# Altium footprint library Conectores.PcbLib: 68 footprints (part 3 of 5)
Each footprint in its own frame and in the unit in brackets; x right, y up, seen from the top. Pads: shape width x height; smd on the part's side, far side on the other; paste and mask are expansions set on the pad; w line width, h text height; cw(c..) or ccw(c..) is an arc to the next point about the centre after c.
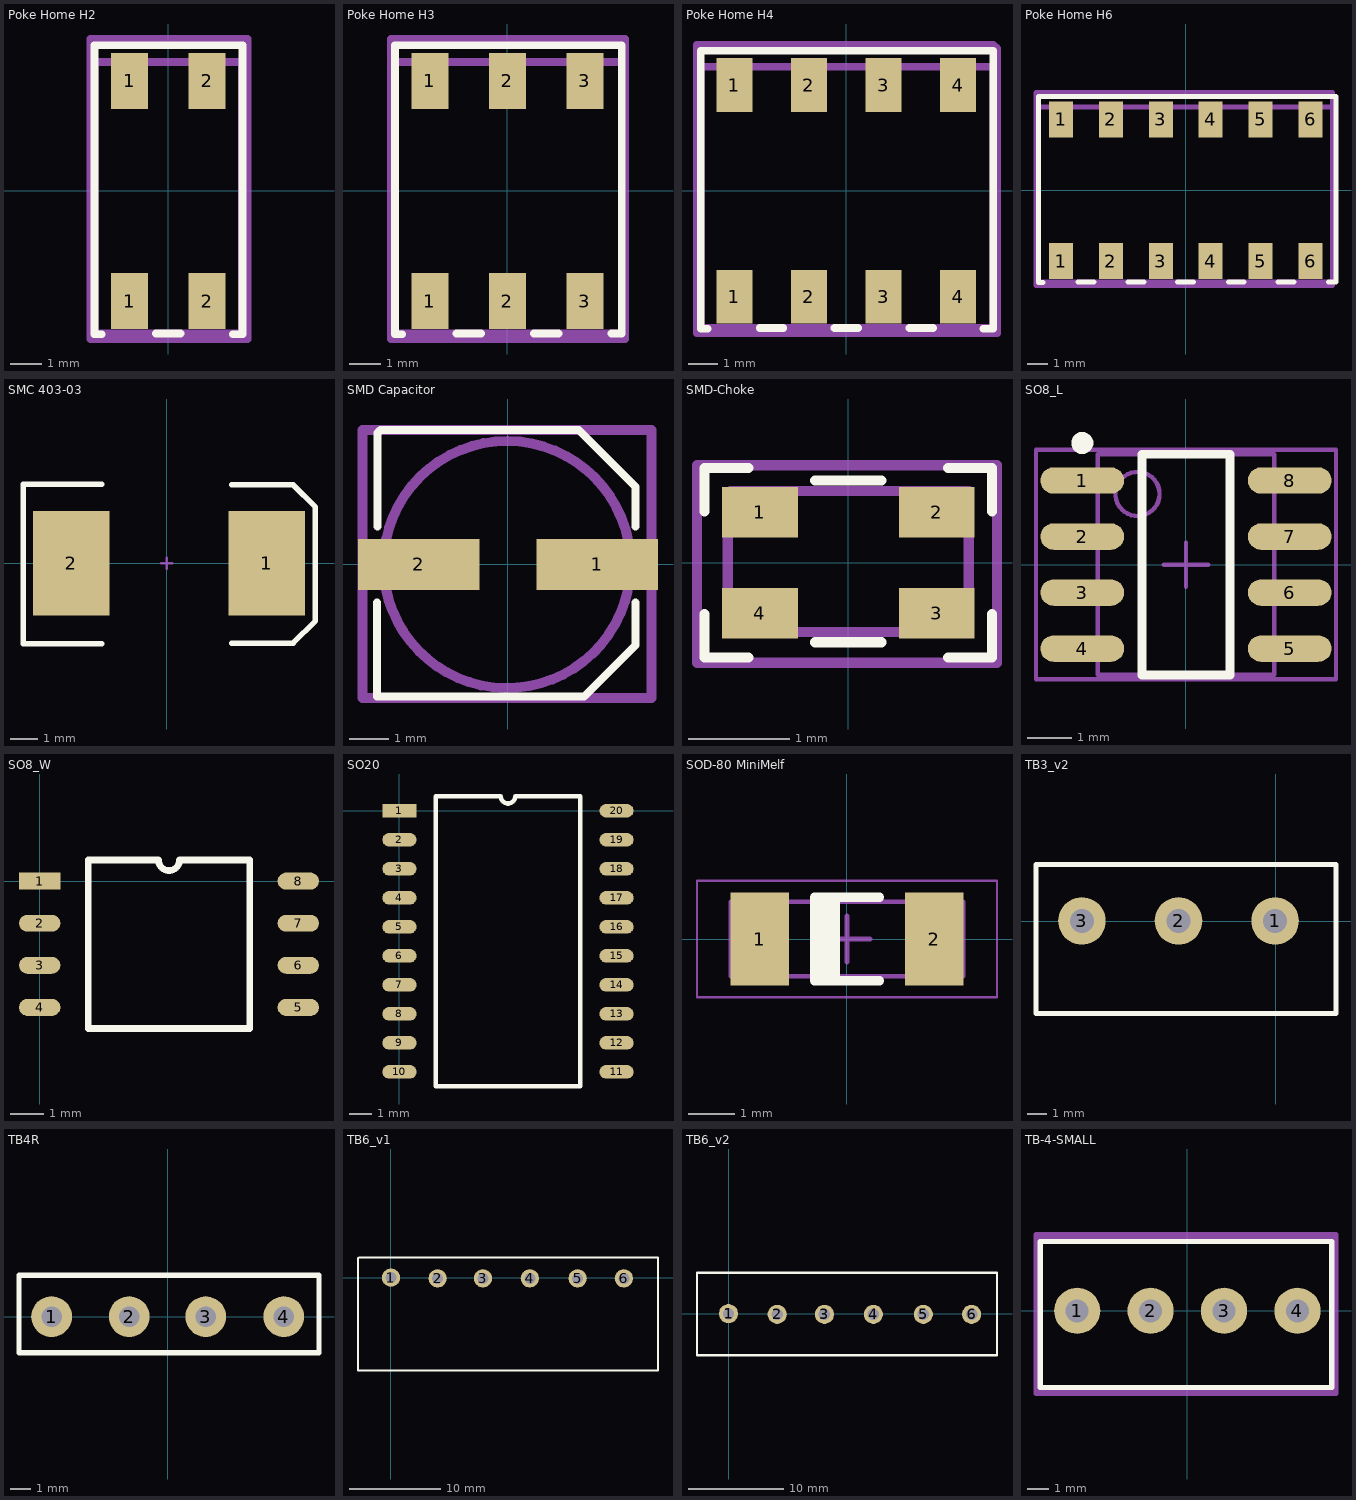
[diagram p2: the footprints below, top view; thin cyan lines are the x and y axes]

## Poke Home H2 [mm] "AVX Poke-Home: Horizontal 18-26 AWG: WTB - 2 ways"
pads (4):
  rect 1.2x1.8 smd: 1(-1.25,-3.55) 1(-1.25,3.55) 2(1.25,-3.55) 2(1.25,3.55)
Top Overlay:
  lines w0.254: -2.148,-4.623 -2.377,-4.623 -2.377,4.699 2.398,4.699 2.398,-4.623 2.094,-4.623 ; -0.396,-4.597 0.392,-4.597
Mechanical 13:
  lines w0.254: -2.377,-4.597 -2.377,4.166 2.373,4.166 2.373,-4.597 -2.377,-4.597
Mechanical 15:
  lines w0.254: -2.504,-4.775 2.551,-4.775 2.551,4.902 -2.504,4.902 -2.504,-4.775
3D body: height 5.1, standoff 0, extent -2.489,-4.674 2.511,4.326

## Poke Home H3 [mm] "AVX Poke-Home: Horizontal 18-26 AWG: WTB - 3 ways"
pads (6):
  rect 1.2x1.8 smd: 1(-2.5,-3.55) 1(-2.5,3.55) 2(0,-3.55) 2(0,3.55) 3(2.5,-3.55) 3(2.5,3.55)
Top Overlay:
  lines w0.254: -3.398,-4.623 -3.627,-4.623 -3.627,4.699 3.688,4.699 3.688,-4.597 3.358,-4.597 ; -1.646,-4.597 -0.858,-4.597 ; 0.856,-4.597 1.644,-4.597
Mechanical 13:
  lines w0.254: -3.627,-4.597 3.688,-4.597 3.688,4.166 -3.627,4.166 -3.627,-4.597
Mechanical 15:
  lines w0.254: -3.754,-4.775 -3.754,4.902 3.79,4.902 3.79,-4.775 -3.754,-4.775
3D body: height 5.1, standoff 0, extent -3.754,-4.703 3.746,4.297

## Poke Home H4 [mm] "AVX Poke-Home: Horizontal 18-26 AWG: WTB - 4 ways"
pads (8):
  rect 1.2x1.8 smd: 1(-3.75,-3.55) 1(-3.75,3.55) 2(-1.25,-3.55) 2(-1.25,3.55) 3(1.25,-3.55) 3(1.25,3.55) 4(3.75,-3.55) 4(3.75,3.55)
Top Overlay:
  lines w0.254: -4.648,-4.623 -4.877,-4.623 -4.877,4.699 4.928,4.699 4.928,-4.623 4.597,-4.623 ; -2.896,-4.597 -2.108,-4.597 ; -0.394,-4.597 0.394,-4.597 ; 2.121,-4.597 2.908,-4.597
Mechanical 13:
  lines w0.254: -4.877,-4.597 -4.877,4.166 4.928,4.166 4.928,-4.597 -4.877,-4.597
Mechanical 15:
  lines w0.254: -5.004,-4.775 5.055,-4.775 5.055,4.775 4.928,4.902 -5.004,4.902 -5.004,-4.775
3D body: height 5.1, standoff 0, extent -4.995,-4.735 5.005,4.265

## Poke Home H6 [mm] "AVX Poke-Home: Horizontal 18-26 AWG: WTB - 6 ways"
pads (12):
  rect 1.2x1.8 smd: 1(-6.25,-3.55) 1(-6.25,3.55) 2(-3.75,-3.55) 2(-3.75,3.55) 3(-1.25,-3.55) 3(-1.25,3.55) 4(1.25,-3.55) 4(1.25,3.55) 5(3.75,-3.55) 5(3.75,3.55) 6(6.25,-3.55) 6(6.25,3.55)
Top Overlay:
  lines w0.254: -7.148,-4.623 -7.377,-4.623 -7.377,4.699 7.528,4.699 7.528,-4.597 7.147,-4.597 ; -5.396,-4.597 -4.608,-4.597 ; -2.894,-4.597 -2.106,-4.597 ; -0.405,-4.597 0.383,-4.597 ; 2.135,-4.597 2.923,-4.597 ; 4.625,-4.597 5.412,-4.597
Mechanical 13:
  lines w0.254: -7.377,-4.597 7.401,-4.597 7.401,4.166 -7.377,4.166 -7.377,-4.597
Mechanical 15:
  lines w0.254: -7.504,-4.775 -7.504,4.902 7.35,4.902 7.35,-4.775 -7.504,-4.775
3D body: height 5.1, standoff 0, extent -7.475,-4.724 7.525,4.276

## SMC 403-03 [mil] "SMC; 2 C-Bend Leads"
height 104.33
pads (2):
  rect 110x150 smd: 1(144.17,0) 2(-137.81,0)
Top Overlay:
  lines w7.87: -93.5,-116 -207,-116 -207,114 -93.5,114 ; 93.5,-115 182,-115 214,-83 214,80.76 182.11,113 93.5,113
Mechanical 1:
  lines w3.94: -7.87,0 7.87,0 ; 0,-7.87 0,7.87
3D body: height 86.61, standoff 0, extent -156.48,-118.13 158.48,116.13

## SMD Capacitor [mm] "SMD Aluminum Cap. 6.3x6.3 mm"
pads (2):
  rect 3.1x1.3 smd: 1(2.275,0) 2(-2.275,0)
Top Overlay:
  lines w0.2: -3.338,-0.965 -3.338,-3.368 1.941,-3.368 3.251,-2.057 3.251,-0.965 ; -3.327,0.965 -3.327,3.353 -3.251,3.429 1.803,3.429 3.251,1.981 3.251,0.972
Mechanical 13:
  lines w0.254: 2.991,0.908 ccw(c-0.025,0) 3.007,0.852
Mechanical 15:
  lines w0.254: -3.708,-3.404 -3.708,3.429 3.658,3.429 3.658,-3.404 -3.708,-3.404
3D body: height 3.91, standoff 0, extent -3.52,-3.3 3.48,3.3

## SMD-Choke [mm] "2 Line Common Mode Choke Surface Mount - DLW21H"
pads (4):
  rect 0.75x0.5 smd: 1(-0.875,0.5) 2(0.875,0.5) 3(0.875,-0.5) 4(-0.875,-0.5)
Top Overlay:
  lines w0.1: -1.422,-0.508 -1.422,-0.94 -0.991,-0.94 ; -1.422,0.508 -1.422,0.94 -0.991,0.94 ; -0.33,-0.787 0.33,-0.787 ; -0.33,0.813 0.33,0.813 ; 0.991,-0.94 1.422,-0.94 1.422,-0.508 ; 0.991,0.94 1.422,0.94 1.422,0.508
Mechanical 13:
  lines w0.1: -1.194,0.686 -1.194,-0.686 1.194,-0.686 1.194,0.711 -1.168,0.711
Mechanical 15:
  lines w0.1: -1.499,-0.991 1.473,-0.991 1.473,0.965 -1.499,0.965 -1.499,-0.991
3D body: height 1, standoff 0, extent -1.162,-0.692 1.139,0.708

## SO8_L [mm] "SOIC-8 Narrow, Pitch 1.27mm, OP07"
height 1.75
pads (8):
  oval 1.9x0.6 smd: 1(-2.35,1.905) 2(-2.35,0.635) 3(-2.35,-0.635) 4(-2.35,-1.905) 5(2.35,-1.905) 6(2.35,-0.635) 7(2.35,0.635) 8(2.35,1.905)
Top Overlay:
  circle w0.25: c-2.35,2.755 r0.125
  lines w0.2: -1,-2.5 1,-2.5 1,2.5 -1,2.5 -1,-2.5
Mechanical 13:
  circle w0.1: c-1.1,1.6 r0.5
  lines w0.1: -2,-2.5 2,-2.5 2,2.5 -2,2.5 -2,-2.5
Mechanical 15:
  lines w0.1: -0.5,0 0.5,0 ; 0,-0.5 0,0.5 ; -3.4,-2.6 3.4,-2.6 3.4,2.6 -3.4,2.6 -3.4,-2.6
3D body: height 1.7, standoff 0, extent -3,-2.424 3,2.476

## SO8_W [mm] "SOIC-8 Wide"
pads (8):
  rect 1.25x0.51 smd: 1(0,0)
  oval 1.25x0.51 smd: 2(0,-1.27) 3(0,-2.54) 4(0,-3.81) 5(7.8,-3.81) 6(7.8,-2.54) 7(7.8,-1.27) 8(7.8,0)
Top Overlay:
  lines w0.2: 1.46,-4.445 6.34,-4.445 6.34,0.635 4.217,0.635 cw(c3.9,0.635) 3.582,0.635 1.46,0.635 1.46,-4.445
3D body: height 1.75, standoff -0.01, extent -0.14,-4.635 7.962,0.825

## SO20 [mm] "SOT163-1: plastic small outline package; 20 leads; body width 7.5 mm"
pads (20):
  rect 1.5x0.6 smd: 1(0,0)
  oval 1.5x0.6 smd: 2(0,-1.27) 3(0,-2.54) 4(0,-3.81) 5(0,-5.08) 6(0,-6.35) 7(0,-7.62) 8(0,-8.89) 9(0,-10.16) 10(0,-11.43) 11(9.5,-11.43) 12(9.5,-10.16) 13(9.5,-8.89) 14(9.5,-7.62) 15(9.5,-6.35) 16(9.5,-5.08) 17(9.5,-3.81) 18(9.5,-2.54) 19(9.5,-1.27) 20(9.5,0)
Top Overlay:
  lines w0.2: 1.585,-12.065 7.915,-12.065 7.915,0.635 5.067,0.635 cw(c4.75,0.635) 4.432,0.635 1.585,0.635 1.585,-12.065
3D body: height 2.7, standoff 0, extent -0.476,-12.115 9.824,0.685

## SOD-80 MiniMelf [mm] "FDLL4148 Small Signal Diode"
height 1.6
pads (2):
  rect 1.25x2 smd: 1(-1.875,0) 2(1.875,0)
Top Overlay:
  rectangle: -0.7,-0.9 -0.15,0.9
  lines w0.2: 0.7,-0.9 -0.7,-0.9 -0.7,0.9 0.7,0.9
Mechanical 13:
  lines w0.1: -2.5,-0.8 -2.5,0.8 2.5,0.8 2.5,-0.8 -2.5,-0.8
Mechanical 15:
  lines w0.05: -3.225,-1.25 -3.225,1.25 3.225,1.25 3.225,-1.25 -3.225,-1.25
  lines w0.1: -0.5,0 0.5,0 ; 0,-0.5 0,0.5
3D body: height 1.6, standoff 0, extent -1.854,-0.798 1.846,0.798

## TB3_v2 [mm] "Terminal Block 3 ways"
pads (3):
  round 2.5 hole 1.25: 1(-0.025,0.025) 2(-5.105,0.025) 3(-10.185,0.025)
Top Overlay:
  lines w0.254: -12.598,-4.851 3.175,-4.851 3.175,2.997 -12.598,2.997 -12.598,-4.851
3D body: height 10, standoff -3, extent -12.524,-4.699 3.076,2.901

## TB4R [mm] "Terminal block 5.08mm right angle 4 ways"
pads (4):
  round 2 hole 1: 1(-5.702,0) 2(-1.892,0) 3(1.867,0) 4(5.702,0)
Top Overlay:
  lines w0.254: -7.302,-1.778 7.429,-1.778 7.429,2.032 -7.302,2.032 -7.302,-1.778
3D body: height 7.2, standoff -3.5, extent -8.319,-8.029 8.311,1.171

## TB6_v1 [mm] "Terminal Block 6 ways"
pads (6):
  round 2 hole 1.2: 1(0,0) 2(5.105,-0.076) 3(10.058,-0.076) 4(15.189,-0.076) 5(20.422,-0.076) 6(25.476,-0.076)
Top Overlay:
  lines w0.254: -3.607,2.108 -3.607,-10.16 29.159,-10.16 29.21,-10.109 29.21,2.21 -3.505,2.21
3D body: height 8.55, standoff -4.1, extent -3.464,-10.008 29.016,1.992

## TB6_v2 [mm] "Terminal Block 6 ways"
pads (6):
  round 2 hole 1.2: 1(0,0) 2(5.105,-0.076) 3(10.058,-0.076) 4(15.189,-0.076) 5(20.422,-0.076) 6(25.476,-0.076)
Top Overlay:
  lines w0.254: -3.302,-4.343 -3.302,4.267 28.143,4.267 28.143,-4.343 -3.302,-4.343
3D body: height 10, standoff -3.5, extent -3.079,-4.112 27.971,3.988

## TB-4-SMALL [mm] "4 Position Wire to Board Terminal Block Horizontal with Board 0.138\" (3.50mm) Through Hole"
pads (4):
  round 2.2 hole 1.1: 1(-5.25,0) 2(-1.75,0) 3(1.75,0) 4(5.25,0)
Top Overlay:
  lines w0.254: -7.01,-3.658 -7.01,3.302 6.883,3.302 6.883,-3.658 -7.01,-3.658
Mechanical 13:
  lines w0.254: -7.036,-3.734 -7.036,3.404 6.934,3.404 6.934,-3.785 -6.985,-3.785
Mechanical 15:
  lines w0.254: -7.214,-3.937 -7.214,3.632 7.087,3.632 7.087,-3.937 -7.214,-3.937
3D body: height 8.5, standoff -3.5, extent -7.068,-3.81 6.932,3.49